# Altium footprint library Hydra_Ref_pcb.PcbLib: 353 footprints (part 12 of 23)
Each footprint in its own frame and in the unit in brackets; x right, y up, seen from the top. Pads: shape width x height; smd on the part's side, far side on the other; paste and mask are expansions set on the pad; w line width, h text height; cw(c..) or ccw(c..) is an arc to the next point about the centre after c.
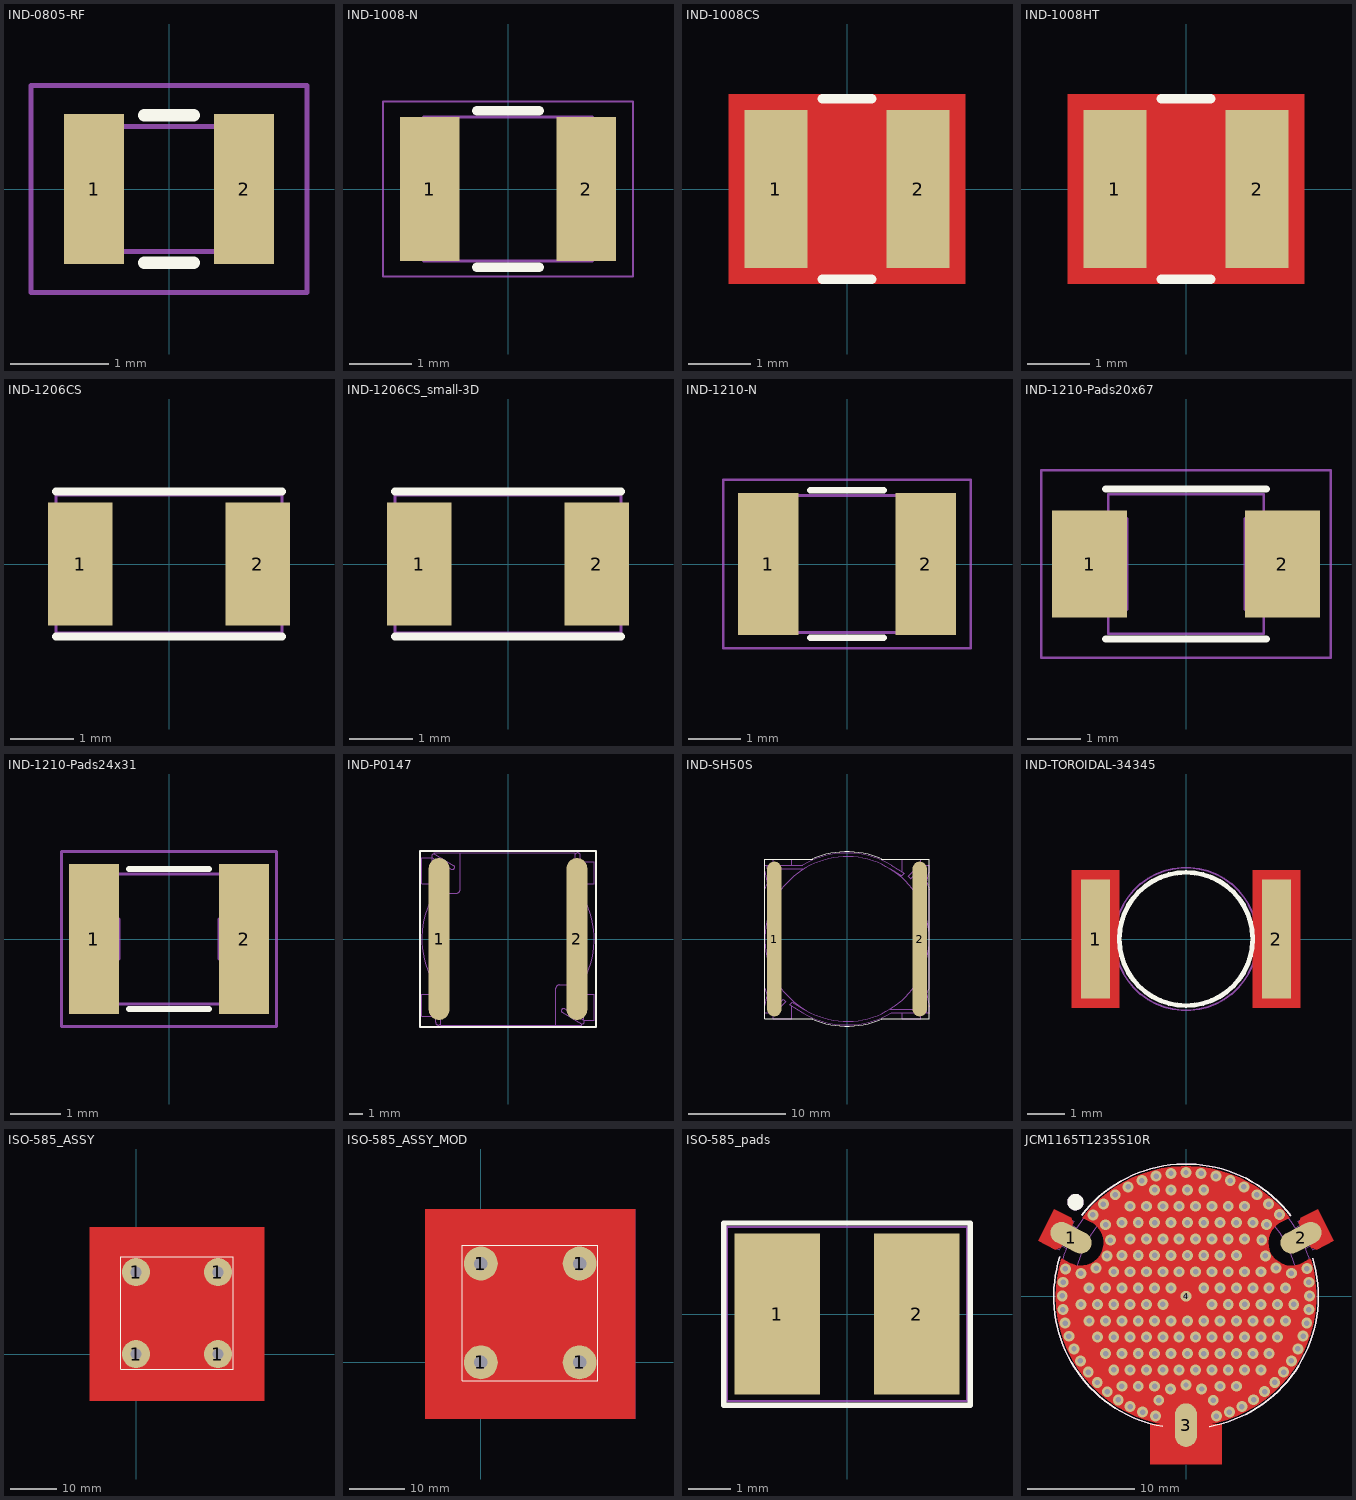
[diagram p11: the footprints below, top view; thin cyan lines are the x and y axes]

## IND-0805-RF [mil] "CB*0805 ACT Inc"
height 60
pads (2):
  rect 24x60 smd mask+3: 1(-30,0) 2(30,0)
Top Overlay:
  lines w5: -9.84,-29.53 9.84,-29.53 ; -9.84,29.53 9.84,29.53
9 Top Assy:
  lines w2: -30,-25 -30,25 30,25 30,-25 -30,-25
  text ".Designator" at -25.59,-7.87 h15
13 Top 3D Bodies:
  lines w2: -55.12,-41.34 -55.12,41.34 55.12,41.34 55.12,-41.34 -55.12,-41.34
3D body: height 51.18, standoff 0.39, extent -55.11,-41.34 55.12,41.34

## IND-1008-N [mm]
height 2.21
pads (2):
  rect 0.95x2.3 smd: 1(-1.25,0) 2(1.25,0)
Top Overlay:
  lines w0.152: -0.5,-1.25 0.5,-1.25 ; -0.5,1.25 0.5,1.25
9 Top Assy:
  lines w0.051: -1.35,-1.15 -1.35,1.15 1.35,1.15 1.35,-1.15 -1.35,-1.15
  text ".Designator" at -1.1,-0.3 h0.65
13 Top 3D Bodies:
  lines w0.025: -0.826,-0.508 -0.826,0.508 ; 0.826,-0.508 0.826,0.508 ; -2,-1.4 -2,1.4 2,1.4 2,-1.4 -2,-1.4
3D body: height 2.21, standoff 0.01, extent -2,-1.4 2,1.4

## IND-1008CS [mil] "Coilcraft 1008CS SM Inductor 115X110X80(mil)"
height 79.92
pads (2):
  rect 40x100 smd: 1(-45,0) 2(45,0)
Top Layer:
  pour cut-out: -75,60 75,60 75,-60 -75,-60
Top Overlay:
  lines w6: -15.75,-57.09 15.75,-57.09 ; -15.75,57.09 15.75,57.09
Top Solder:
  pour cut-out: -76,-61 76,-61 76,61 -76,61
9 Top Assy:
  lines w2: -57.5,-55 57.5,-55 57.5,55 -57.5,55 -57.5,-55
  text ".Designator" at -53.15,-13.78 h30
3D body: height 79.92, standoff 0, extent -57.5,-55 57.5,55

## IND-1008HT [mil] "Coilcraft 1008HT SM Inductor 105X95X45(mil)"
height 45
pads (2):
  rect 40x100 smd: 1(-45,0) 2(45,0)
Top Layer:
  pour cut-out: -75,60 75,60 75,-60 -75,-60
Top Overlay:
  lines w6: -15.75,-57.09 15.75,-57.09 ; -15.75,57.09 15.75,57.09
Top Solder:
  pour cut-out: -76,-61 76,-61 76,61 -76,61
9 Top Assy:
  lines w2: -53,-47 53,-47 53,47 -53,47 -53,-47
  text ".Designator" at -53.15,-13.78 h30
3D body: height 45, standoff 0, extent -53,-47 53,47

## IND-1206CS [mil] "Coilcraft 1206CS SM Inductor 140x85X60(mil)"
height 60
pads (2):
  rect 40x76 smd mask+3: 1(-55,0) 2(55,0)
Top Overlay:
  lines w5: -70.12,-45 70,-45 ; -70,45 70.12,45
9 Top Assy:
  lines w2: -70,-43 -70,43 70,43 70,-43 -70,-43
  text ".Designator" at -61.02,-17.72 h34
13 Top 3D Bodies:
  lines w2: -70,-43 70,-43 70,43 -70,43 -70,-43
3D body: height 60, standoff 0.39, extent -70,-43 70,43

## IND-1206CS_small-3D [mil] "Coilcraft 1206CS SM Inductor 140x85X60(mil)"
height 60
pads (2):
  rect 40x76 smd mask+3: 1(-55,0) 2(55,0)
Top Overlay:
  lines w5: -70.12,-45 70,-45 ; -70,45 70.12,45
9 Top Assy:
  lines w2: -70,-43 70,-43 70,43 -70,43 -70,-43
  text ".Designator" at -61.02,-17.72 h34
13 Top 3D Bodies:
  lines w2: -70,-43 -70,43 70,43 70,-43 -70,-43
3D body: height 60, standoff 0.39, extent -70,-43 70,43

## IND-1210-N [mm] "126X98X60"
height 1.524
pads (2):
  rect 1.15x2.7 smd mask+0.076: 1(-1.5,0) 2(1.5,0)
Top Overlay:
  lines w0.127: -0.7,-1.4 0.7,-1.4 ; -0.7,1.4 0.7,1.4
9 Top Assy:
  lines w0.051: -1.7,-1.3 1.7,-1.3 1.7,1.3 -1.7,1.3 -1.7,-1.3
  text ".Designator" at -1.55,-0.45 h0.86
13 Top 3D Bodies:
  lines w0.051: -2.35,-1.6 -2.35,1.6 2.35,1.6 2.35,-1.6 -2.35,-1.6
3D body: height 1.52, standoff 0.01, extent -2.35,-1.6 2.35,1.6

## IND-1210-Pads20x67 [mm] "126X98X87 -Narrow Pads -.020x.067"
height 2.4
pads (2):
  rect 1.4x2 smd mask+0.076: 1(-1.8,0) 2(1.8,0)
Top Overlay:
  lines w0.127: -1.5,-1.4 1.5,-1.4 ; -1.5,1.4 1.5,1.4
9 Top Assy:
  lines w0.051: -1.45,-0.85 -1.6,-0.85 -1.6,0.85 -1.45,0.85 ; 1.45,-0.85 1.6,-0.85 1.6,0.85 1.45,0.85 ; -1.45,-1.3 1.45,-1.3 1.45,1.3 -1.45,1.3 -1.45,-1.3
  text ".Designator" at -1.25,-0.35 h0.7
13 Top 3D Bodies:
  lines w0.051: -2.7,-1.75 -2.7,1.75 2.7,1.75 2.7,-1.75 -2.7,-1.75
22 Part Dimentions & Info:
  lines w0.051: -1.6,-0.85 -1.6,0.85 -1.1,0.85 -1.1,-0.85 -1.6,-0.85 ; 1.1,-0.85 1.1,0.85 1.6,0.85 1.6,-0.85 1.1,-0.85
3D body: height 2.4, standoff 0.01, extent -2.7,-1.75 2.7,1.75

## IND-1210-Pads24x31 [mm] "126X98X87 -Narrow Pads -.024x.031"
height 2.4
pads (2):
  rect 1x3 smd mask+0.076: 1(-1.5,0) 2(1.5,0)
Top Overlay:
  lines w0.127: -0.8,-1.4 0.8,-1.4 ; -0.8,1.4 0.8,1.4
9 Top Assy:
  lines w0.051: -1.45,-0.4 -1.6,-0.4 -1.6,0.4 -1.45,0.4 ; 1.45,-0.4 1.6,-0.4 1.6,0.4 1.45,0.4 ; -1.45,-1.3 -1.45,1.3 1.45,1.3 1.45,-1.3 -1.45,-1.3
  text ".Designator" at -1.25,-0.35 h0.7
13 Top 3D Bodies:
  lines w0.051: -2.15,-1.75 2.15,-1.75 2.15,1.75 -2.15,1.75 -2.15,-1.75
22 Part Dimentions & Info:
  lines w0.051: -1.6,-0.4 -1,-0.4 -1,0.4 -1.6,0.4 -1.6,-0.4 ; 1,-0.4 1.6,-0.4 1.6,0.4 1,0.4 1,-0.4
3D body: height 2.4, standoff 0.01, extent -2.15,-1.75 2.15,1.75

## IND-P0147 [mil] ".500X.500x..215\" toroidan inductor G_PN LSD2-06500"
height 215
pads (2):
  oval 60x470 smd mask+3: 1(-200,0) 2(200,0)
Top Overlay:
  lines w5: -255,-255 255,-255 255,255 -255,255 -255,-255
9 Top Assy:
  lines w2: -210.29,-169.71 -225.93,-154.07 -209.88,-170.12 -209.88,-241.83 ; -149.84,250 195,250 195,170 195,167 195,165 215.93,144.07 ; 195.31,245.82 cw(c202.09,241.83) 209.96,241.86 ; 200,-133 200,160 ; 209.88,169.71 209.88,241.83 ; 210,-133 210,149.84 ; 210.29,135.19 cw(c0,0) 212.06,-132.41 ; 210.29,169.71 225.93,154.07 ; 211,224 250,224 250,160 220,160 ; 214,-247 214,-250 139,-250 139,-170 139,-143 cw(c149,-143) 149,-133 214,-133 cw(c214,-138) 219,-138 219,-235 ; 216.04,144.14 ccw(c218,152) 225.86,153.96 ; 219,-160 250,-160 250,-235 219,-235 ; -250,-224 -250,-160 ; -250,-224 -211,-224 -250,-224 ; -250,-224 -250,-160 ; -250,-160 -220,-160 -250,-160 ; -250,160 -250,235 ; -250,160 -219,160 -250,160 ; -250,160 -250,235 ; -250,235 -219,235 ; -250,235 -219,235 ; -219,138 ccw(c-214,138) -214,133 ; -219,138 ccw(c-214,138) -214,133 ; -219,138 -219,235 ; -219,138 -219,235 ; -219,235 cw(c-214.98,239.98) -212.2,245.75 ; -219,235 cw(c-214.98,239.98) -212.2,245.75 ; -219,235 -163.96,202.31 ; -219,235 -163.96,202.31 ; -214,133 -149,133 ; -214,133 -149,133 ; -214,250 -139,250 ; -214,250 -214,247 -214,250 ; -214,250 -139,250 ; -212.2,245.75 -157.17,213.06 ; -212.2,245.75 -157.17,213.06 ; -195,-250 149.84,-250 -195,-250 ; -195,-250 -195,-170 ; -195,-250 -195,-170 ; -195,-170 -195,-167 ; -195,-170 -195,-167 ; -195,-167 -195,-165 ; -195,-167 -195,-165 ; -195,-165 -215.93,-144.07 -195,-165 ; -163.96,202.31 ccw(c-161.18,208.08) -157.17,213.06 ; -163.96,202.31 ccw(c-161.18,208.08) -157.17,213.06 ; -149,133 ccw(c-149,143) -139,143 ; -149,133 ccw(c-149,143) -139,143 ; -139,143 -139,170 ; -139,143 -139,170 ; -139,170 -139,250 ; -139,170 -139,250 ; 219,-235 cw(c214.98,-239.98) 212.2,-245.75 157.17,-213.06 cw(c161.18,-208.08) 163.96,-202.31 219,-235 ; -225.86,-153.96 cw(c-218,-152) -216.04,-144.14 ccw(c-218,-152) -225.86,-153.96 ; -212.06,132.41 ccw(c0,0) -210.29,-135.19 cw(c0,0) -212.06,132.41 ; -210,-149.84 -210,133 -210,-149.84 ; -209.96,-241.86 ccw(c-202.09,-241.83) -195.31,-245.82 cw(c-202.09,-241.83) -209.96,-241.86 ; -200,-160 -200,133 -200,-160
  text ".Designator" at -135,-30 h60
3D body: height 450.98, standoff 0.39, extent -265,-265 265,265

## IND-SH50S [mm] ".135x.050 toroidan inductor G_PN 34345"
height 11.455
pads (2):
  oval 1.5x16 smd mask+0.076: 1(-7.5,0) 2(7.5,0)
Top Overlay:
  lines w0.127: -3.564,-8.272 ccw(c0.001,-0.124) 3.564,-8.273 ; -3.564,-8.255 -8.509,-8.255 -8.509,8.255 -3.564,8.255 ; -3.564,8.273 cw(c-0.001,0.124) 3.564,8.272 ; 3.564,-8.255 8.509,-8.255 8.509,8.255 3.564,8.255
9 Top Assy:
  circle w0.051: c0,0 r8.5
  lines w0.051: -8.255,7.62 -8.255,7.239 -4.445,7.239 ; -7.62,7.62 -7.62,8.255 -5.715,8.255 -5.715,7.62 ; -5.715,-6.906 -5.715,-8.255 -7.62,-8.255 -7.62,-7.747 -6.35,-6.477 -6.604,-6.223 -8.001,-7.62 -8.509,-7.62 -8.509,-6.985 -8.255,-5.842 -8.509,-5.08 -8.509,-1.27 -8.509,5.08 -8.255,5.715 -8.509,6.985 -8.509,7.62 -4.574,7.62 ; -4.574,-7.623 ccw(c0,0) 4.574,-7.623 ; -4.574,7.623 cw(c0,0) 4.574,7.623 5.901,6.79 5.657,6.546 4.445,7.239 ; -4.572,-7.62 -5.901,-6.79 -5.657,-6.546 -4.445,-7.239 ; 4.445,-7.239 8.255,-7.239 8.255,-7.62 7.62,-7.62 7.62,-8.255 5.715,-8.255 5.715,-7.62 ; 4.572,-7.62 8.509,-7.62 8.509,-6.985 8.255,-5.715 8.509,-5.08 8.509,1.27 8.509,5.08 8.255,5.842 8.509,6.985 8.509,7.62 8.001,7.62 6.604,6.223 6.35,6.477 7.62,7.747 7.62,8.255 5.715,8.255 5.715,6.906
  text ".Designator" at -6.223,-0.635 h1.52
3D body: height 11.46, standoff 0.01, extent -8.89,-9.271 8.89,9.271

## IND-TOROIDAL-34345 [mil] ".135x.050 toroidan inductor G_PN 34345"
height 60
pads (2):
  rect 30x125 smd mask+3: 1(-95,0) 2(95,0)
Top Layer:
  pour cut-out: -120,72 -70,72 -70,-72 -120,-72
  pour cut-out: 70,72 120,72 120,-72 70,-72
Top Overlay:
  circle w5: c0,0 r70
9 Top Assy:
  circle w2: c0,0 r75
  text ".Designator" at -65,-15 h38
3D body: height 60, standoff 0.39, extent -118.11,-82.67 118.11,82.68

## ISO-585_ASSY [mil] "ISO-585 Outline ONLY, connected to the pads with TWO wires"
height 230
pads (4):
  round 240 hole 96: 1(0,0) 1(0,700) 1(700,0) 1(700,700)
Top Layer:
  rectangle: -120,-120 820,820
  pour cut-out: -395,1085 1095,1085 1095,-400 -395,-400
Mid-Layer 1:
  rectangle: -120,-120 820,820
  pour cut-out: -395,1085 1095,1085 1095,-400 -395,-400
MidLayer3:
  rectangle: -120,-120 820,820
  pour cut-out: -395,1085 1095,1085 1095,-400 -395,-400
MidLayer2:
  rectangle: -120,-120 820,820
  pour cut-out: -395,1085 1095,1085 1095,-400 -395,-400
Top Overlay:
  lines w5: -130,-130 830,-130 830,830 -130,830 -130,-130
Bottom Overlay:
  lines w5: -130,100 -130,-130 100,-130 ; -130,150 -130,325 ; -130,375 -130,550 ; -130,600 -130,830 100,830 ; 150,-130 325,-130 ; 150,830 325,830 ; 375,-130 550,-130 ; 375,830 550,830 ; 600,-130 830,-130 830,100 ; 600,830 830,830 830,600 ; 830,150 830,325 ; 830,375 830,550
Top Solder:
  rectangle: -125,-125 825,825
Internal Plane 1:
  rectangle: -395,-400 1095,-120
  region: 1095,-127 1095,1085 820,1085 820,-127
  region: 1095,1085 -395,1085 -395,819.99 1095,819.99
  region: -395,1085 -395,-400 -120,-400 -120,1085
9 Top Assy:
  lines w2: -115,-115 -115,815 815,815 815,-115 -115,-115
  text ".Designator" at 236.6,327.02 h60
3D body: height 240, standoff 0, extent -128,-130 828,830

## ISO-585_ASSY_MOD [mil] "ISO-585 Outline ONLY, connected to the pads with TWO wires"
height 230
pads (4):
  round 240 hole 96: 1(0,0) 1(0,700) 1(700,0) 1(700,700)
Top Layer:
  pour cut-out: -395,1085 1095,1085 1095,-400 -395,-400
Mid-Layer 1:
  rectangle: -130,-130 830,830
  pour cut-out: -395,1085 1095,1085 1095,-400 -395,-400
MidLayer3:
  rectangle: -130,-130 830,830
  pour cut-out: -395,1085 1095,1085 1095,-400 -395,-400
MidLayer2:
  rectangle: -130,-130 830,830
  pour cut-out: -395,1085 1095,1085 1095,-400 -395,-400
Bottom Layer:
  rectangle: -130,-130 830,830
  pour cut-out: -395,1085 1095,1085 1095,-400 -395,-400
Top Overlay:
  lines w5: -130,-130 -130,830 830,830 830,-130 -130,-130
Bottom Overlay:
  lines w5: -130,100 -130,-130 100,-130 ; -130,150 -130,325 ; -130,375 -130,550 ; -130,600 -130,830 100,830 ; 150,-130 325,-130 ; 150,830 325,830 ; 375,-130 550,-130 ; 375,830 550,830 ; 600,-130 830,-130 830,100 ; 600,830 830,830 830,600 ; 830,150 830,325 ; 830,375 830,550
Top Solder:
  rectangle: -120,-120 120,120
  rectangle: 580,-120 820,120
  rectangle: 580,580 820,820
  rectangle: -120,580 120,820
  region: 323,-115 -395,-115 -395,-400 323,-400
  region: 1095,499.99 775,499.99 775,185 1095,185
  lines w240: 0,0 700,0 700,700 0,700 0,5
Bottom Solder:
  rectangle: -125,-125 825,825
Internal Plane 1:
  region: 830,185 830,-400 1095,-400 1095,185
  region: 1095,1085 -395,1085 -395,830 1095,830
  region: -130,-130 -130,1085 -395,1085 -395,-130
  region: 1095,-130 323,-130 323,-400 1095,-400
  region: 1095,499.99 1095,1084.99 830,1084.99 830,499.99
9 Top Assy:
  lines w2: -115,-115 815,-115 815,815 -115,815 -115,-115
  text ".Designator" at 236.6,327.02 h60
3D body: height 240, standoff 0, extent -130,-130 830,830
3D body: height 1, standoff 0, extent -130,-130 830,830

## ISO-585_pads [mil] "only 2 PADS FOR ISO-585"
height 50
pads (2):
  rect 80x150 smd: 1(-65,0) 2(65,0)
Top Overlay:
  lines w5: -115,-85 115,-85 115,85 -115,85 -115,-85
9 Top Assy:
  lines w2: -115,-85 -115,85 115,85 115,-85 -115,-85 ; -111.93,-81.18 111.93,-81.18 111.93,81.18 -111.93,81.18 -111.93,-81.18
  text ".Designator" at -100,-30 h58
3D body: height 50, standoff 0, extent -115,-85 115,85

## JCM1165T1235S10R [mil] "surface mount circulator 3 pins"
height 300
pads (4):
  oval 80x160 smd rot 63: 1(-421.26,214.57)
  oval 80x160 smd rot 117: 2(422,215)
  oval 80x160 smd: 3(0,-472.44)
  round 40 hole 20 paste+1000: 4(0,0)
via -355,-90 diameter 40 hole 20
via -385,-30 diameter 40 hole 20
via -355,30 diameter 40 hole 20
via -295,-210 diameter 40 hole 20
via -325,-150 diameter 40 hole 20
via -295,-90 diameter 40 hole 20
via -325,-30 diameter 40 hole 20
via -295,30 diameter 40 hole 20
via -235,-330 diameter 40 hole 20
via -265,-270 diameter 40 hole 20
via -235,-210 diameter 40 hole 20
via -265,-150 diameter 40 hole 20
via -235,-90 diameter 40 hole 20
via -265,-30 diameter 40 hole 20
via -235,30 diameter 40 hole 20
via -265,90 diameter 40 hole 20
via -235,150 diameter 40 hole 20
via -235,270 diameter 40 hole 20
via -175,-330 diameter 40 hole 20
via -205,-270 diameter 40 hole 20
via -175,-210 diameter 40 hole 20
via -205,-150 diameter 40 hole 20
via -175,-90 diameter 40 hole 20
via -205,-30 diameter 40 hole 20
via -175,30 diameter 40 hole 20
via -205,90 diameter 40 hole 20
via -175,150 diameter 40 hole 20
via -205,210 diameter 40 hole 20
via -175,270 diameter 40 hole 20
via -205,330 diameter 40 hole 20
via -115,-330 diameter 40 hole 20
via -145,-270 diameter 40 hole 20
via -115,-210 diameter 40 hole 20
via -145,-150 diameter 40 hole 20
via -115,-90 diameter 40 hole 20
via -145,-30 diameter 40 hole 20
via -115,30 diameter 40 hole 20
via -145,90 diameter 40 hole 20
via -115,150 diameter 40 hole 20
via -145,210 diameter 40 hole 20
via -115,270 diameter 40 hole 20
via -145,330 diameter 40 hole 20
via -115,390 diameter 40 hole 20
via -85,-270 diameter 40 hole 20
via -55,-210 diameter 40 hole 20
via -85,-150 diameter 40 hole 20
via -55,-90 diameter 40 hole 20
via -85,-30 diameter 40 hole 20
via -55,30 diameter 40 hole 20
via -85,90 diameter 40 hole 20
via -55,150 diameter 40 hole 20
via -85,210 diameter 40 hole 20
via -55,270 diameter 40 hole 20
via -85,330 diameter 40 hole 20
via -55,390 diameter 40 hole 20
via -25,-270 diameter 40 hole 20
via 5,-210 diameter 40 hole 20
via -25,-150 diameter 40 hole 20
via 5,-90 diameter 40 hole 20
via -25,90 diameter 40 hole 20
via 5,150 diameter 40 hole 20
via -25,210 diameter 40 hole 20
via 5,270 diameter 40 hole 20
via -25,330 diameter 40 hole 20
via 5,390 diameter 40 hole 20
via 35,-270 diameter 40 hole 20
via 65,-210 diameter 40 hole 20
via 35,-150 diameter 40 hole 20
via 65,-90 diameter 40 hole 20
via 65,30 diameter 40 hole 20
via 35,90 diameter 40 hole 20
via 65,150 diameter 40 hole 20
via 35,210 diameter 40 hole 20
via 65,270 diameter 40 hole 20
via 35,330 diameter 40 hole 20
via 65,390 diameter 40 hole 20
via 125,-330 diameter 40 hole 20
via 95,-270 diameter 40 hole 20
via 125,-210 diameter 40 hole 20
via 95,-150 diameter 40 hole 20
via 125,-90 diameter 40 hole 20
via 95,-30 diameter 40 hole 20
via 125,30 diameter 40 hole 20
via 95,90 diameter 40 hole 20
via 125,150 diameter 40 hole 20
via 95,210 diameter 40 hole 20
via 125,270 diameter 40 hole 20
via 95,330 diameter 40 hole 20
via 185,-330 diameter 40 hole 20
via 155,-270 diameter 40 hole 20
via 185,-210 diameter 40 hole 20
via 155,-150 diameter 40 hole 20
via 185,-90 diameter 40 hole 20
via 155,-30 diameter 40 hole 20
via 185,30 diameter 40 hole 20
via 155,90 diameter 40 hole 20
via 185,150 diameter 40 hole 20
via 155,210 diameter 40 hole 20
via 185,270 diameter 40 hole 20
via 155,330 diameter 40 hole 20
via 215,-270 diameter 40 hole 20
via 245,-210 diameter 40 hole 20
via 215,-150 diameter 40 hole 20
via 245,-90 diameter 40 hole 20
via 215,-30 diameter 40 hole 20
via 245,30 diameter 40 hole 20
via 215,90 diameter 40 hole 20
via 215,210 diameter 40 hole 20
via 245,270 diameter 40 hole 20
via 215,330 diameter 40 hole 20
via 275,-270 diameter 40 hole 20
via 305,-210 diameter 40 hole 20
via 275,-150 diameter 40 hole 20
via 305,-90 diameter 40 hole 20
via 275,-30 diameter 40 hole 20
via 305,30 diameter 40 hole 20
via 275,90 diameter 40 hole 20
via 335,-150 diameter 40 hole 20
via 365,-90 diameter 40 hole 20
via 335,-30 diameter 40 hole 20
via 365,30 diameter 40 hole 20
via 395,-30 diameter 40 hole 20
via 302.92,337.85 diameter 40 hole 20
via 259.63,372.15 diameter 40 hole 20
via 212.5,400.93 diameter 40 hole 20
via 162.21,423.78 diameter 40 hole 20
via 109.52,440.35 diameter 40 hole 20
via 55.21,450.39 diameter 40 hole 20
via 0.08,453.76 diameter 40 hole 20
via -55.05,450.41 diameter 40 hole 20
via -109.36,440.39 diameter 40 hole 20
via -162.06,423.84 diameter 40 hole 20
via -212.35,401.01 diameter 40 hole 20
via -259.5,372.24 diameter 40 hole 20
via -302.8,337.95 diameter 40 hole 20
via -290.26,147.82 diameter 40 hole 20
via -277.15,205.67 diameter 40 hole 20
via -329.36,103.21 diameter 40 hole 20
via -294.72,262.33 diameter 40 hole 20
via -341.62,298.66 diameter 40 hole 20
via -385.53,84.12 diameter 40 hole 20
via -442.48,100.71 diameter 40 hole 20
via 291,148.25 diameter 40 hole 20
via 330.1,103.64 diameter 40 hole 20
via 277.89,206.11 diameter 40 hole 20
via 386.27,84.56 diameter 40 hole 20
via 443.22,101.14 diameter 40 hole 20
via 295.47,262.76 diameter 40 hole 20
via 342.36,299.09 diameter 40 hole 20
via 111.08,-439.66 diameter 40 hole 20
via 100,-381.38 diameter 40 hole 20
via -111.08,-439.66 diameter 40 hole 20
via -100,-381.38 diameter 40 hole 20
via 57.5,-340 diameter 40 hole 20
via -57.5,-340 diameter 40 hole 20
via 0,-325.41 diameter 40 hole 20
via 158.89,-424.73 diameter 40 hole 20
via 204.77,-404.61 diameter 40 hole 20
via 248.14,-379.56 diameter 40 hole 20
via 288.49,-349.88 diameter 40 hole 20
via 325.31,-315.93 diameter 40 hole 20
via 358.17,-278.13 diameter 40 hole 20
via 386.66,-236.93 diameter 40 hole 20
via 410.43,-192.84 diameter 40 hole 20
via 429.19,-146.4 diameter 40 hole 20
via 442.72,-98.17 diameter 40 hole 20
via 450.85,-48.75 diameter 40 hole 20
via 453.47,1.27 diameter 40 hole 20
via 450.57,51.27 diameter 40 hole 20
via -450.89,51.29 diameter 40 hole 20
via -453.8,1.26 diameter 40 hole 20
via -451.17,-48.8 diameter 40 hole 20
via -443.03,-98.25 diameter 40 hole 20
via -429.5,-146.51 diameter 40 hole 20
via -410.72,-192.99 diameter 40 hole 20
via -386.93,-237.1 diameter 40 hole 20
via -358.42,-278.33 diameter 40 hole 20
via -325.54,-316.16 diameter 40 hole 20
via -288.69,-350.13 diameter 40 hole 20
via -248.31,-379.83 diameter 40 hole 20
via -204.91,-404.9 diameter 40 hole 20
via -159.01,-425.03 diameter 40 hole 20
Top Layer:
  region: 65,-505 65,-575 -65,-575 -65,-505 -50,-490 50,-490
  region: -479.47,171.35 -541.84,203.13 -482.82,318.96 -420.45,287.18 -413.89,267.01 -459.29,177.9
  region: 420.45,287.18 482.82,318.96 541.84,203.13 479.47,171.35 459.29,177.91 413.89,267.01
  region: 197 vertices and 0 holes, not listed, extent -477.34,-469.01 476.92,476.92
  pour cut-out: -84.29,-470 -84.29,-433.07 -84.3,-433.07 -84.3,-432.87 -84.3,-424.56 -81.06,-408.28 -74.71,-392.94 -65.48,-379.13 -53.74,-367.39 -39.93,-358.16 -24.59,-351.8 -8.3,-348.57 0,-348.57 8.3,-348.57 24.59,-351.8 39.93,-358.16 53.74,-367.39 65.48,-379.13 74.71,-392.94 81.06,-408.28 84.3,-424.56 84.3,-432.87 84.3,-470 131,-470 131,-615 -131,-615 -131,-470
Top Overlay:
  circle w30: c-405.16,345.28 r15
  lines w5: -463.01,144.38 ccw(c0,0) -85.44,-477.42 ; -383.11,297.41 cw(c0,0) 384.42,295.71 ; 84.57,-477.57 ccw(c0,0) 464.41,139.82
Top Paste:
  drawing of 4 lines, arcs and shapes, not listed
Top Solder:
  drawing of 4 lines, arcs and shapes, not listed
Bottom Solder:
  drawing of 1 lines, arcs and shapes, not listed
9 Top Assy:
  circle w1: c0,0 r415
  circle w2: c0,0 r315
  circle w2: c0,0 r215
  circle w2: c0,0 r130
  circle w1: c-281.05,-305.34 r25
  circle w1: c-351.93,-219.93 r25
  circle w1: c-397.64,-118.78 r25
  circle w1: c-414.9,-9.14 r25
  circle w1: c98.86,190.92 r25
  circle w1: c-98.86,190.92 r25
  circle w1: c0,215 r25
  circle w1: c206.92,237.51 r25
  circle w1: c144.84,279.72 r25
  circle w1: c74.54,306.05 r25
  circle w1: c-206.92,237.51 r25
  circle w1: c-144.84,279.73 r25
  circle w1: c-74.54,307.05 r25
  circle w1: c0,315 r25
  circle w1: c-272.61,312.91 r25
  circle w1: c-190.82,368.53 r25
  circle w1: c-98.2,403.21 r25
  circle w1: c98.2,403.21 r25
  circle w1: c190.82,368.53 r25
  circle w1: c272.61,312.91 r25
  circle w1: c0,415 r25
  circle w2: c0,0 r472.44
  circle w30: c-405.16,345.28 r15
  lines w1: -339.17,2.14 ccw(c-314.97,-4.13) -337.72,6.25 ; -327.35,-88.79 ccw(c-302.36,-88.35) -327.05,-84.44 ; -292.48,-168.96 cw(c-267.64,-166.11) -291.61,-173.23 ; -239.18,3.45 ccw(c-214.98,-2.82) -237.73,7.56 ; -236.53,-241.13 cw(c-213.37,-231.73) -234.55,-245.01 ; -207.51,-116.23 cw(c-182.68,-113.38) -206.64,-120.5 ; -165.6,-375.55 cw(c-189.74,-369.08) -164.74,-369.08 ; -163.3,-295.68 cw(c-143.5,-280.42) -160.35,-298.88 ; -117.75,-206.66 cw(c-97.94,-191.4) -114.79,-209.86 ; 85.66,-406.06 ccw(c0,0) 400.61,108.34 ; 100.44,-215.6 cw(c99.45,-190.62) 104.76,-215.05 ; 146.7,-304.26 cw(c145.71,-279.28) 151.02,-303.71 ; 192.66,-393.08 cw(c191.65,-368.1) 196.98,-392.52 ; 197.3,-132.82 cw(c183.56,-111.94) 200.72,-130.12 ; 222.83,-253.84 cw(c215.19,-230.04) 226.85,-252.15 ; 237.55,-11.92 cw(c215,-1.12) 239.08,-7.84 ; 282.68,-184.88 cw(c268.94,-164) 286.1,-182.18 ; 290.91,-327.11 cw(c283.24,-303.31) 294.92,-325.41 ; 321.88,-102.4 cw(c303.04,-85.96) 324.45,-98.88 ; 337.54,-12.44 cw(c315,-1.65) 339.08,-8.36 ; 367.9,-237.23 cw(c354.14,-216.36) 371.31,-234.53 ; 418,-130.02 cw(c399.15,-113.59) 420.56,-126.5 ; 437.55,-13.31 cw(c414.99,-2.53) 439.08,-9.23
  lines w2: -438.92,176.14 -455.95,184.82 -463.54,169.91 -491.61,184.21 -473.73,219.29 ccw(c-464.8,236.83) -455.86,254.37 -437.99,289.44 -409.92,275.15 -417.52,260.24 -400.19,251.41 ; -42.32,-470.5 -42.32,-490.16 -59.06,-490.16 -59.06,-521.65 -19.69,-521.65 cw(c0,-521.65) 19.69,-521.65 59.06,-521.65 59.06,-490.16 42.32,-490.16 42.32,-470.3 ; 0,415 cw(c0,0) 338.91,239.51 ; 400.15,251.39 417.52,260.24 409.92,275.15 437.99,289.44 455.86,254.37 ccw(c464.8,236.83) 473.73,219.29 491.61,184.21 463.54,169.91 455.95,184.82 439.32,176.34
  lines w5: -463.01,144.38 ccw(c0,0) -85.44,-477.42 ; -383.11,297.41 cw(c0,0) 384.42,295.71 ; 84.57,-477.57 ccw(c0,0) 464.41,139.82
  text ".Designator" at -145,-35 h75
3D body: height 230, standoff 0, extent -485,-481 485,485